# Altium footprint library Adafruit PyGamer1.PcbLib: 42 footprints (part 3 of 3)
Each footprint in its own frame and in the unit in brackets; x right, y up, seen from the top. Pads: shape width x height; smd on the part's side, far side on the other; paste and mask are expansions set on the pad; w line width, h text height; cw(c..) or ccw(c..) is an arc to the next point about the centre after c.
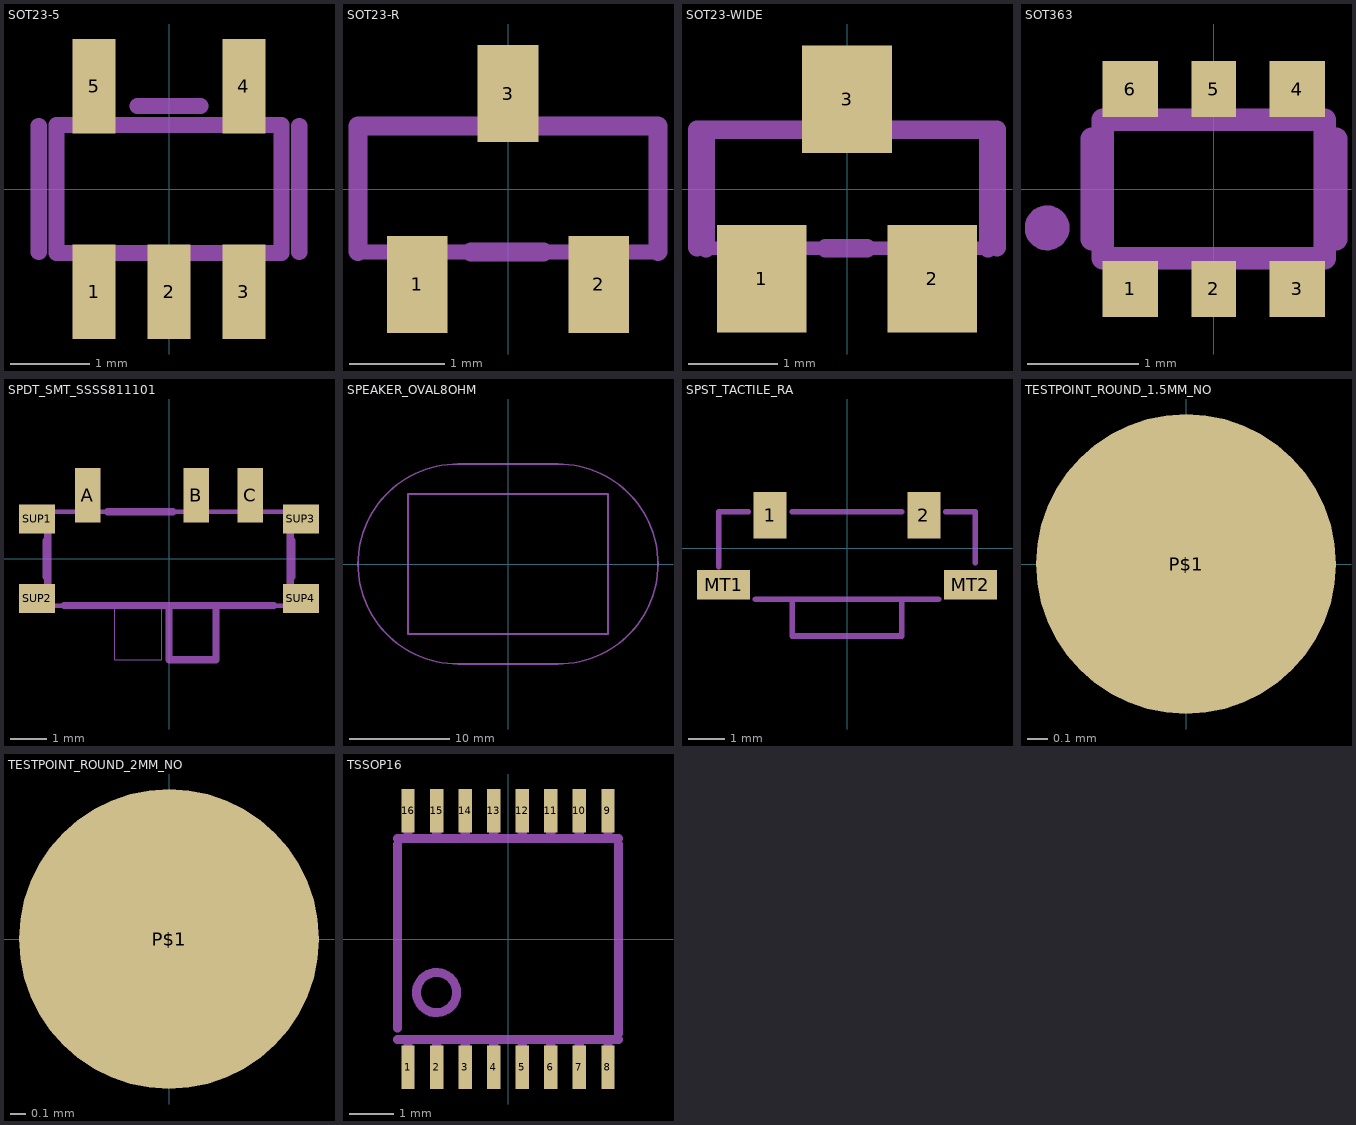
[diagram p2: the footprints below, top view; thin cyan lines are the x and y axes]

## SOT23-5 [mm]
pads (5):
  rect 0.55x1.2 smd: 1(-0.95,-1.3) 2(0,-1.3) 3(0.95,-1.3) 4(0.95,1.3) 5(-0.95,1.3)
Mechanical 3:
  region: -1.2,-1.5 -1.2,-0.85 -0.7,-0.85 -0.7,-1.5
  region: -0.25,-1.5 -0.25,-0.85 0.25,-0.85 0.25,-1.5
  region: 0.7,-1.5 0.7,-0.85 1.2,-0.85 1.2,-1.5
  region: 0.7,0.85 0.7,1.5 1.2,1.5 1.2,0.85
  region: -1.2,0.85 -1.2,1.5 -0.7,1.5 -0.7,0.85
  lines w0.203: -1.422,-0.811 1.422,-0.811 1.422,0.811 -1.422,0.811 -1.422,-0.811
Mechanical 7:
  lines w0.203: -1.65,-0.8 -1.65,0.8 ; -0.4,1.05 0.4,1.05 ; 1.65,-0.8 1.65,0.8

## SOT23-R [mm]
pads (3):
  rect 0.635x1.016 smd: 1(-0.95,-1) 2(0.95,-1) 3(0,1)
Mechanical 3:
  region: -0.229,0.711 -0.229,1.295 0.229,1.295 0.229,0.711
  region: 0.711,-1.295 0.711,-0.711 1.168,-0.711 1.168,-1.295
  region: -1.168,-1.295 -1.168,-0.711 -0.711,-0.711 -0.711,-1.295
  lines w0.152: -1.573,0.66 -1.573,-0.66 1.573,-0.66 1.573,0.66
  lines w0.203: -1.573,0.66 1.573,0.66
Mechanical 7:
  lines w0.203: -1.573,-0.653 -1.573,0.66 -0.564,0.66 ; -0.386,-0.66 0.372,-0.66 ; 0.564,0.66 1.573,0.66 1.573,-0.653

## SOT23-WIDE [mm]
pads (3):
  rect 1x1.2 smd: 1(-0.95,-1) 2(0.95,-1) 3(0,1)
Mechanical 3:
  region: -0.229,0.711 -0.229,1.295 0.229,1.295 0.229,0.711
  region: 0.711,-1.295 0.711,-0.711 1.168,-0.711 1.168,-1.295
  region: -1.168,-1.295 -1.168,-0.711 -0.711,-0.711 -0.711,-1.295
  lines w0.152: -1.573,-0.66 1.573,-0.66
  lines w0.203: -1.573,-0.66 -1.573,0.66 1.573,0.66 1.573,-0.66
Mechanical 7:
  lines w0.203: -1.672,-0.653 -1.672,0.66 -0.713,0.66 ; -0.236,-0.66 0.223,-0.66 ; 0.713,0.66 1.672,0.66 1.672,-0.653

## SOT363 [mm]
pads (6):
  rect 0.5x0.5 smd: 1(-0.75,-0.9) 3(0.75,-0.9) 4(0.75,0.9) 6(-0.75,0.9)
  rect 0.4x0.5 smd: 2(0,-0.9) 5(0,0.9)
Mechanical 3:
  region: -0.125,-1.05 -0.125,-0.7 0.125,-0.7 0.125,-1.05
  region: -0.775,-1.05 -0.775,-0.7 -0.525,-0.7 -0.525,-1.05
  region: 0.525,-1.05 0.525,-0.7 0.775,-0.7 0.775,-1.05
  region: -0.775,0.7 -0.775,1.05 -0.525,1.05 -0.525,0.7
  region: -0.125,0.7 -0.125,1.05 0.125,1.05 0.125,0.7
  region: 0.525,0.7 0.525,1.05 0.775,1.05 0.775,0.7
  lines w0.203: -1,-0.625 1,-0.625 1,0.625 -1,0.625 -1,-0.625
Mechanical 7:
  circle w0.203: c-1.5,-0.35 r0.1
  lines w0.203: -1.1,-0.45 -1.1,0.45 ; 1.1,-0.45 1.1,0.45

## SPDT_SMT_SSSS811101 [mm]
pads (7):
  rect 0.7x1.5 smd: A(-2.25,1.75) B(0.75,1.75) C(2.25,1.75)
  rect 1x0.8 smd: SUP1(-3.65,1.1) SUP2(-3.65,-1.1) SUP3(3.65,1.1) SUP4(3.65,-1.1)
Mechanical 3:
  lines w0: -1.5,-1.3 -1.5,-2.8 -0.2,-2.8 -0.2,-1.3
  lines w0.127: -3.35,-1.3 3.35,-1.3 ; -3.35,1.3 3.35,1.3
  lines w0.203: -3.35,-1.3 -3.35,1.3 ; 0,-1.3 0,-2.8 1.3,-2.8 1.3,-1.3 ; 3.35,-1.3 3.35,1.3
Mechanical 7:
  lines w0.203: -3.4,-0.5 -3.4,0.5 ; -2.9,-1.3 2.9,-1.3 ; -1.7,1.3 0.1,1.3 ; 3.4,-0.5 3.4,0.5

## SPEAKER_OVAL8OHM [mm]
Mechanical 7:
  lines w0.152: -15,0 ccw(c-5,0) -5,-10 5,-10 ccw(c5,0) 15,0 ccw(c5,0) 5,10 -5,10 ccw(c-5,0) -15,0 ; -10,-7 10,-7 10,7 -10,7 -10,-7

## SPST_TACTILE_RA [mm]
pads (4):
  rect 0.9x1.27 smd: 1(-2.1,0.9) 2(2.1,0.9)
  rect 1.45x0.8 smd: MT1(-3.375,-1) MT2(3.375,-1)
Mechanical 7:
  lines w0.152: -3.5,-0.5 -3.5,1 -2.7,1 ; -2.5,-1.4 -1.5,-1.4 ; -1.5,1 1.5,1 ; 2.5,-1.4 1.5,-1.4 ; 2.7,1 3.5,1 3.5,-0.4 ; -1.5,-1.4 1.5,-1.4 ; -1.5,-1.4 -1.5,-2.4 1.5,-2.4 1.5,-1.4

## TESTPOINT_ROUND_1.5MM_NO [mm]
pads (1):
  rrect100% 1.5x1.5 smd paste+0: P$1(0,0)

## TESTPOINT_ROUND_2MM_NO [mm]
pads (1):
  rrect100% 2x2 smd paste+0: P$1(0,0)

## TSSOP16 [mil]
pads (16):
  rect 12x39 smd: 1(-89.57,-114.87) 2(-63.98,-114.87) 3(-38.39,-114.87) 4(-12.8,-114.87) 5(12.8,-114.87) 6(38.39,-114.87) 7(63.98,-114.87) 8(89.57,-114.87) 9(89.57,114.87) 10(63.98,114.87) 11(38.39,114.87) 12(12.8,114.87) 13(-12.8,114.87) 14(-38.39,114.87) 15(-63.98,114.87) 16(-89.57,114.87)
Mechanical 3:
  region: -93.57,-122.87 -93.57,-89.87 -85.57,-89.87 -85.57,-122.87
  region: -67.98,-122.87 -67.98,-89.87 -59.98,-89.87 -59.98,-122.87
  region: -42.39,-122.87 -42.39,-89.87 -34.39,-89.87 -34.39,-122.87
  region: -16.8,-122.87 -16.8,-89.87 -8.8,-89.87 -8.8,-122.87
  region: 8.8,-122.87 8.8,-89.87 16.8,-89.87 16.8,-122.87
  region: 34.39,-122.87 34.39,-89.87 42.39,-89.87 42.39,-122.87
  region: 59.98,-122.87 59.98,-89.87 67.98,-89.87 67.98,-122.87
  region: 85.57,-122.87 85.57,-89.87 93.57,-89.87 93.57,-122.87
  region: 85.57,89.87 85.57,122.87 93.57,122.87 93.57,89.87
  region: 59.98,89.87 59.98,122.87 67.98,122.87 67.98,89.87
  region: 34.39,89.87 34.39,122.87 42.39,122.87 42.39,89.87
  region: 8.8,89.87 8.8,122.87 16.8,122.87 16.8,89.87
  region: -16.8,89.87 -16.8,122.87 -8.8,122.87 -8.8,89.87
  region: -42.39,89.87 -42.39,122.87 -34.39,122.87 -34.39,89.87
  region: -67.98,89.87 -67.98,122.87 -59.98,122.87 -59.98,89.87
  region: -93.57,89.87 -93.57,122.87 -85.57,122.87 -85.57,89.87
  lines w8: -99,-89.87 99,-89.87 ; -99,89.87 99,89.87
Mechanical 7:
  circle w8: c-64,-48 r18
  lines w8: -99,-79.87 -99,84.87 ; 99,-84.87 99,84.87